# Altium footprint library MYLIB.PcbLib: 600 footprints (part 39 of 39)
Each footprint in its own frame and in the unit in brackets; x right, y up, seen from the top. Pads: shape width x height; smd on the part's side, far side on the other; paste and mask are expansions set on the pad; w line width, h text height; cw(c..) or ccw(c..) is an arc to the next point about the centre after c.
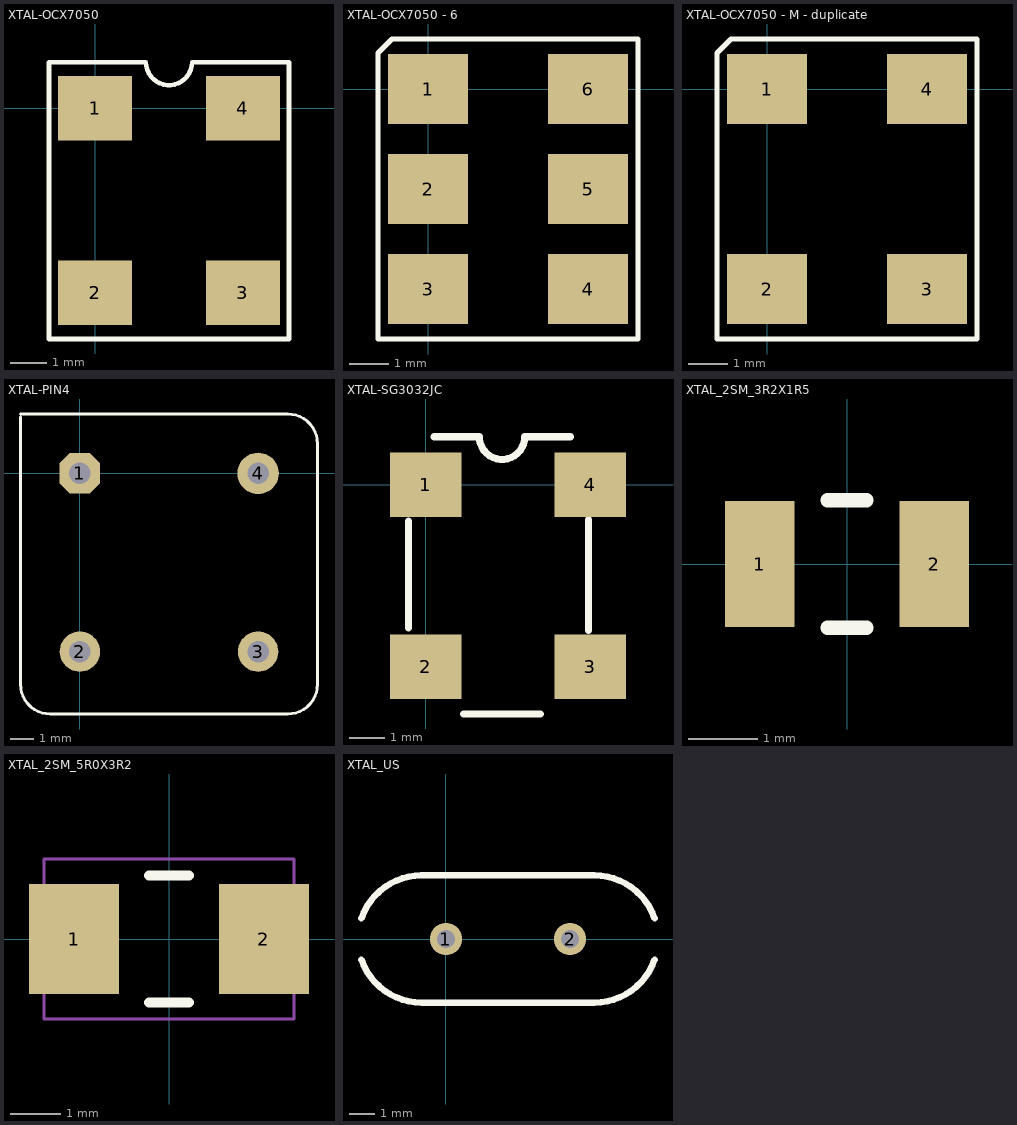
[diagram p38: the footprints below, top view; thin cyan lines are the x and y axes]

## XTAL-OCX7050 [mil]
pads (4):
  rect 80x70 smd: 1(0,0) 2(0,-200) 3(160,-200) 4(160,0)
Top Overlay:
  lines w5: -50,-250 -50,50 55,50 ccw(c80,50) 105,50 210,50 210,-250 -50,-250

## XTAL-OCX7050 - 6 [mil] "斜角标记"
pads (6):
  rect 80x70 smd: 1(0,0) 2(0,-100) 3(0,-200) 4(160,-200) 5(160,-100) 6(160,0)
Top Overlay:
  lines w5: 46,50 210,50 210,-250 -50,-250 -50,36 -36,50 55,50

## XTAL-OCX7050 - M - duplicate [mil] "斜角标记"
pads (4):
  rect 80x70 smd: 1(0,0) 2(0,-200) 3(160,-200) 4(160,0)
Top Overlay:
  lines w5: 46,50 210,50 210,-250 -50,-250 -50,36 -36,50 55,50

## XTAL-PIN4 [mil]
pads (4):
  oct 68x68 hole 36: 1(0,0)
  round 68 hole 36: 2(0,-300) 3(300,-300)
  round 70 hole 36: 4(300,0)
Top Overlay:
  lines w5: -100,95 -100,-355 ccw(c-50,-355) -50,-405 350,-405 ccw(c350,-355) 400,-355 400,50 ccw(c350,50) 350,100 -100,100

## XTAL-SG3032JC [mm]
pads (4):
  rect 2x1.8 smd: 1(0,0) 2(0,-5.08) 3(4.6,-5.08) 4(4.6,0)
Top Overlay:
  lines w0.2: 0.229,1.346 1.499,1.346 ccw(c2.134,1.346) 2.769,1.346 4.039,1.346
  lines w0.203: -0.483,-3.988 -0.483,-1.016 ; 1.067,-6.401 3.2,-6.401 ; 4.547,-4.064 4.547,-0.965

## XTAL_2SM_3R2X1R5 [mm] "CRYSTAL 32.768KHZ 6PF SMD 2 pads"
height 1.1
pads (2):
  rect 1x1.8 smd: 1(-1.25,0) 2(1.25,0)
Top Overlay:
  lines w0.203: -0.279,-0.914 0.279,-0.914 ; -0.279,0.914 0.279,0.914
3D body "ABS07-120.STEP": height 0.89, standoff 0, extent -1.628,-0.752 1.577,0.752

## XTAL_2SM_5R0X3R2 [mm] "CRYSTAL 25M Hz  30F SMD 2 pads"
height 1.3
pads (2):
  rect 1.8x2.2 smd: 1(-1.9,0) 2(1.9,0)
Top Overlay:
  lines w0.203: -0.4,-1.27 0.4,-1.27 ; -0.4,1.27 0.4,1.27
Mechanical 13:
  lines w0.051: -2.5,-1.6 -2.5,1.6 2.5,1.6 2.5,-1.6 -2.5,-1.6
3D body: height 1.3, standoff 0, extent -2.5,-1.6 2.5,1.6

## XTAL_US [mil]
pads (2):
  round 50 hole 28: 1(0,0) 2(192.13,0)
Top Overlay:
  lines w10: -130.92,-31.85 ccw(c-37.79,0) -37.79,-98.42 ; -130.92,31.85 cw(c-37.79,0) -37.79,98.43 ; -38,98.42 229.92,98.43 cw(c229.92,0) 323.05,31.85 ; -37.8,-98.43 229.92,-98.42 ccw(c229.92,0) 323.05,-31.85